# Altium integrated library ALTIUM-MJ_HORIZONTAL_PLASTIC-rev16a.IntLib: 68 symbols (continued)
## 634108149621 (continued)
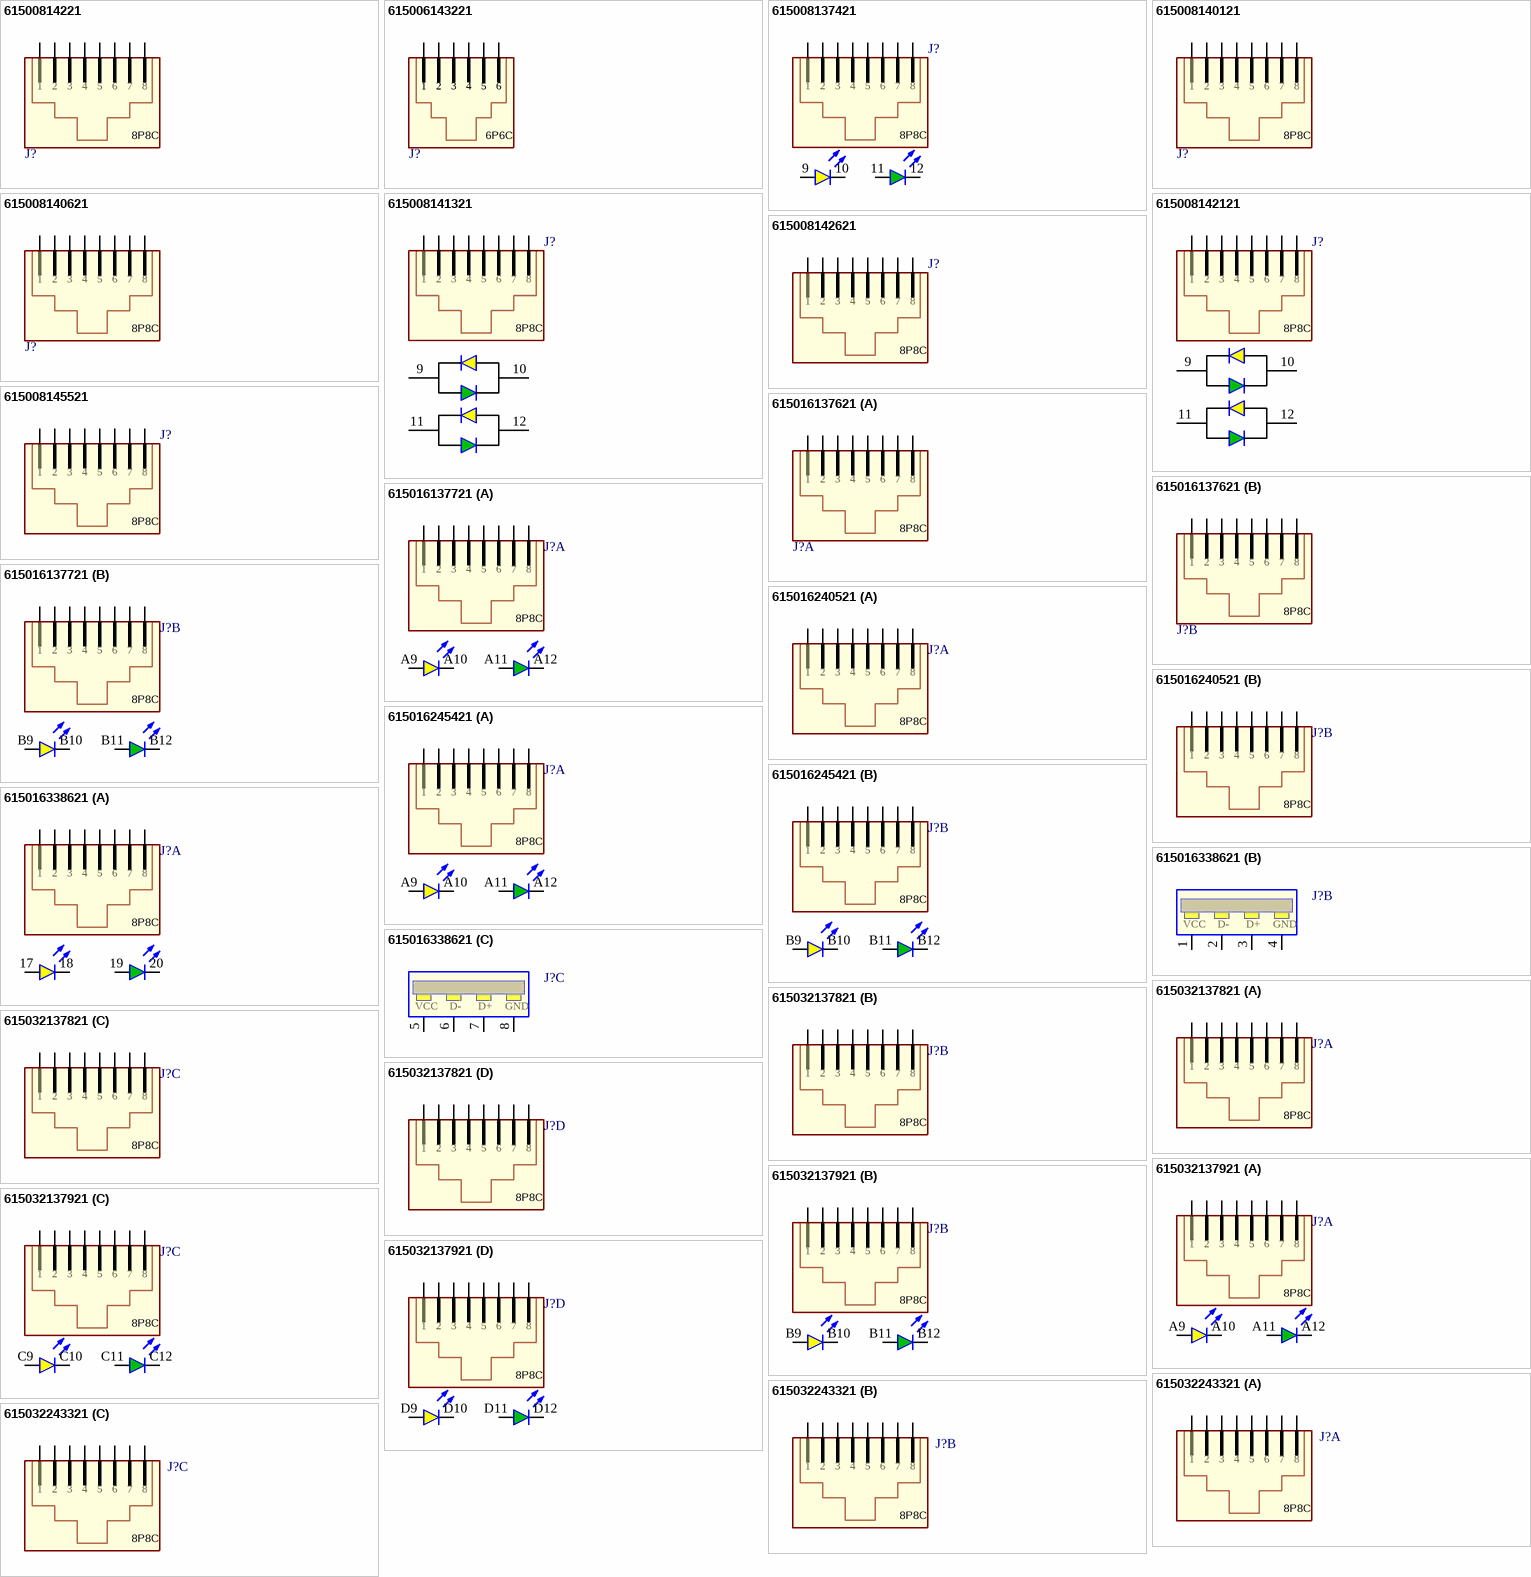
[diagram p3: symbols 61500814221 to 615032243321]

## 61500814221
designator J?
WR-MJ Modular Jack Horizontal Shielded 8P8C Tab Down; PartNumber: 61500814221; PublishedDate: July 2016; Publisher: Wurth Elektronik; ComponentLink1Description: Manufacturer; ComponentLink1URL: http://www.we-online.de; ComponentLink2Description: Datasheet; ComponentLink2URL: http://katalog.we-online.de/em/datasheet/61500814221.pdf; PinNumber: 8P8C
footprint 61500814221 (RJ45 Horizontal  Shielded  Tab down)
pins: 1, 2, 3, 4, 5, 6, 7, 8

## 615006143221
designator J?
WR-MJ Modular Jack Horizontal Shielded 6P6C Tab Up; PartNumber: 615006143221; PublishedDate: July 2016; Publisher: Wurth Elektronik; ComponentLink1Description: Manufacturer; ComponentLink1URL: http://www.we-online.de; ComponentLink2Description: Datasheet; ComponentLink2URL: http://katalog.we-online.de/em/datasheet/615006143221.pdf; PinNumber: 6P6C
footprint 615006143221 (Horizontal Shielded 1x1 TH    6P6C Tab Up)
pins: 1, 2, 3, 4, 5, 6

## 615008137421
designator J?
WR-MJ Modular Jack Horizontal Shielded w. LED and EMI Panel Finger 8P8C Tab Up; PartNumber: 615008137421; PublishedDate: July 2016; Publisher: Wurth Elektronik; ComponentLink1Description: Manufacturer; ComponentLink1URL: http://www.we-online.de; ComponentLink2Description: Datasheet; ComponentLink2URL: http://katalog.we-online.de/em/datasheet/615008137421.pdf; PinNumber: 8P8C
footprint 615008137421 (RJ45 Horizontal  Shielded  With LED With EMI panel ground Tab up - Left yellow - Right green)
pins: 1, 2, 3, 4, 5, 6, 7, 8, 9, 10, 11, 12

## 615008140121
designator J?
WR-MJ Modular Jack Horizontal Shielded 8P8C Tab Down; PartNumber: 615008140121; PublishedDate: July 2016; Publisher: Wurth Elektronik; ComponentLink1Description: Manufacturer; ComponentLink1URL: http://www.we-online.de; ComponentLink2Description: Datasheet; ComponentLink2URL: http://katalog.we-online.de/em/datasheet/615008140121%282%29.pdf; PinNumber: 8P8C
footprint 615008140121 (Horizontal Shielded 1x1 TH   3,05mm 8P8C Tab Down)
pins: 1, 2, 3, 4, 5, 6, 7, 8

## 615008140621
designator J?
WR-MJ Modular Jack Horizontal Shielded w. EMI Panel Finger 8P8C Tab Up; PartNumber: 615008140621; PublishedDate: July 2016; Publisher: Wurth Elektronik; ComponentLink1Description: Manufacturer; ComponentLink1URL: http://www.we-online.de; ComponentLink2Description: Datasheet; ComponentLink2URL: http://katalog.we-online.de/em/datasheet/615008140621.pdf; PinNumber: 8P8C
footprint 615008140621 (Horizontal Shielded 1x1 TH  EMI  fingers  8P8C Tab Up)
pins: 1, 2, 3, 4, 5, 6, 7, 8

## 615008141321
designator J?
WR-MJ Modular Jack Horizontal Shielded w. LED and EMI Panel Finger 8P8C Tab Up; PartNumber: 615008141321; PublishedDate: July 2016; Publisher: Wurth Elektronik; ComponentLink1Description: Manufacturer; ComponentLink1URL: http://www.we-online.de; ComponentLink2Description: Datasheet; ComponentLink2URL: http://katalog.we-online.de/em/datasheet/615008141321%282%29.pdf; PinNumber: 8P8C
footprint 615008141321 (Horizontal Shielded 1x1 TH LED 2x Bipolar Green/Yellow Green=Fw EMI  fingers  8P8C Tab Up)
pins: 1, 2, 3, 4, 5, 6, 7, 8, 9, 10, 11, 12

## 615008142121
designator J?
WR-MJ Modular Jack Horizontal Shielded w. LED and EMI Panel Finger 8P8C Tab Up; PartNumber: 615008142121; PublishedDate: July 2016; Publisher: Wurth Elektronik; ComponentLink1Description: Manufacturer; ComponentLink1URL: http://www.we-online.de; ComponentLink2Description: Datasheet; ComponentLink2URL: http://katalog.we-online.de/em/datasheet/615008142121.pdf; PinNumber: 8P8C
footprint 615008142121 (Horizontal Shielded 1x1 TH LED 2x Bipolar Yellow/Green Yellow=Fw EMI  fingers  8P8C Tab Up)
pins: 1, 2, 3, 4, 5, 6, 7, 8, 9, 10, 11, 12

## 615008142621
designator J?
WR-MJ Modular Jack Horizontal Shielded Rear Grounding Post 8P8C Tab Down; PartNumber: 615008142621; PublishedDate: July 2016; Publisher: Wurth Elektronik; ComponentLink1Description: Manufacturer; ComponentLink1URL: http://www.we-online.de; ComponentLink2Description: Datasheet; ComponentLink2URL: http://katalog.we-online.de/em/datasheet/615008142621.pdf; PinNumber: 8P8C
footprint 615008142621 (Horizontal Shielded 1x1 TH   rear EMI PCB post 8P8C Tab Down)
pins: 1, 2, 3, 4, 5, 6, 7, 8

## 615008145521
designator J?
WR-MJ Modular Jack Horizontal Shielded w. EMI Panel Finger 8P8C CAT 5e Tab Down; PartNumber: 615008145521; PublishedDate: July 2016; Publisher: Wurth Elektronik; ComponentLink1Description: Manufacturer; ComponentLink1URL: http://www.we-online.de; ComponentLink2Description: Datasheet; ComponentLink2URL: http://katalog.we-online.de/em/datasheet/615008145521.pdf; PinNumber: 8P8C
footprint 615008145521 (Cat 5e - Horizontal Shielded - 1x1 - TH -  EMI  fingers  - 8P8C - Tab Down)
pins: 1, 2, 3, 4, 5, 6, 7, 8

## 615016137621
designator J?
WR-MJ Modular Jack Horizontal Shielded Dual Port 8P8C Tab Down; PartNumber: 615016137621; PinNumber: 8P8C x2; PublishedDate: July 2016; Publisher: Wurth Elektronik; ComponentLink1Description: Manufacturer; ComponentLink1URL: http://www.we-online.de; ComponentLink2Description: Datasheet; ComponentLink2URL: http://katalog.we-online.de/em/datasheet/615016137621.pdf
footprint 615016137621 (RJ45 Horizontal Dual port Shielded Tab down)
part A pins: A1, A2, A3, A4, A5, A6, A7, A8
part B pins: B1, B2, B3, B4, B5, B6, B7, B8
part A text: 1; 2; 3; 4; 5; 6; 7; 8; 8P8C
part B text: 1; 2; 3; 4; 5; 6; 7; 8; 8P8C

## 615016137721
designator J?
WR-MJ Modular Jack Horizontal Shielded Dual Port w. EMI Panel Finger 8P8C Tab Up; PartNumber: 615016137721; PublishedDate: July 2016; Publisher: Wurth Elektronik; ComponentLink1Description: Manufacturer; ComponentLink1URL: http://www.we-online.de; ComponentLink2Description: Datasheet; ComponentLink2URL: http://katalog.we-online.de/em/datasheet/615016137721.pdf; PinNumber: 8P8C
footprint 615016137721 (RJ45 Horizontal Dual port Shielded  With LED With EMI panel ground Tab up - left yellow - right green)
part A pins: A1, A2, A3, A4, A5, A6, A7, A8, A9, A10, A11, A12
part B pins: B1, B2, B3, B4, B5, B6, B7, B8, B9, B10, B11, B12
part A text: 1; 2; 3; 4; 5; 6; 7; 8
part B text: 1; 2; 3; 4; 5; 6; 7; 8

## 615016240521
designator J?
WR-MJ Modular Jack Horizontal Shielded Dual Stacked w. EMI Panel Finger 8P8C Tab Up&Down; PartNumber: 615016240521; PinNumber: 8P8C x2; PublishedDate: July 2016; Publisher: Wurth Elektronik; ComponentLink1Description: Manufacturer; ComponentLink1URL: http://www.we-online.de; ComponentLink2Description: Datasheet; ComponentLink2URL: http://katalog.we-online.de/em/datasheet/615016240521.pdf
footprint 615016240521 (Horizontal Shielded 2x1 TH  EMI  fingers  8P8C Tab Down & Up)
part A pins: A1, A2, A3, A4, A5, A6, A7, A8
part B pins: B1, B2, B3, B4, B5, B6, B7, B8
part A text: 1; 2; 3; 4; 5; 6; 7; 8; 8P8C
part B text: 1; 2; 3; 4; 5; 6; 7; 8; 8P8C

## 615016245421
designator J?
WR-MJ Modular Jack Horizontal Shielded Dual Stacked w. LED and EMI Panel Finger 8P8C Tab Up&Down; PartNumber: 615016245421; PublishedDate: July 2016; Publisher: Wurth Elektronik; ComponentLink1Description: Manufacturer; ComponentLink1URL: http://www.we-online.de; ComponentLink2Description: Datasheet; ComponentLink2URL: http://katalog.we-online.de/em/datasheet/615016245421.pdf; PinNumber: 8P8C
footprint 615016245421 (Horizontal Shielded 2x1 TH  EMI  fingers with LED (Yellow=left / Green=right) 8P8C Tab Down & Up)
part A pins: A1, A2, A3, A4, A5, A6, A7, A8, A9, A10, A11, A12
part B pins: B1, B2, B3, B4, B5, B6, B7, B8, B9, B10, B11, B12
part A text: 1; 2; 3; 4; 5; 6; 7; 8
part B text: 1; 2; 3; 4; 5; 6; 7; 8

## 615016338621
designator J?
WR-MJ Modular Jack Tab Up . LED 8P8C Dual USB; PartNumber: 615016338621; PublishedDate: July 2016; Publisher: Wurth Elektronik; ComponentLink1Description: Manufacturer; ComponentLink1URL: http://www.we-online.de; ComponentLink2Description: Datasheet; ComponentLink2URL: http://katalog.we-online.de/em/datasheet/615016338621.pdf; PinNumber: 8P8C
footprint 615016338621 (RJ45 + dual USB stacked Horizontal Tab up)
part A pins: 9, 10, 11, 12, 13, 14, 15, 16, 17, 18, 19, 20
part B pins: 1 VCC, 2 D-, 3 D+, 4 GND
part C pins: 5 VCC, 6 D-, 7 D+, 8 GND

## 615032137821
designator J?
WR-MJ Modular Jack Horizontal Shielded Ganged 4 Ports 8P8C Tab Down; PartNumber: 615032137821; PinNumber: 8P8C x4; PublishedDate: July 2016; Publisher: Wurth Elektronik; ComponentLink1Description: Manufacturer; ComponentLink1URL: http://www.we-online.de; ComponentLink2Description: Datasheet; ComponentLink2URL: http://katalog.we-online.de/em/datasheet/615032137821.pdf
footprint 615032137821 (WR-MJ Modular Jack Horizontal Shielded Ganged 4 Ports 8P8C Tab Down)
part A pins: A1, A2, A3, A4, A5, A6, A7, A8
part B pins: B1, B2, B3, B4, B5, B6, B7, B8
part C pins: C1, C2, C3, C4, C5, C6, C7, C8
part D pins: D1, D2, D3, D4, D5, D6, D7, D8
part A text: 1; 2; 3; 4; 5; 6; 7; 8; 8P8C
part B text: 1; 2; 3; 4; 5; 6; 7; 8; 8P8C
part C text: 1; 2; 3; 4; 5; 6; 7; 8; 8P8C
part D text: 1; 2; 3; 4; 5; 6; 7; 8; 8P8C

## 615032137921
designator J?
WR-MJ Modular Jack Horizontal Shielded Ganged 4 Ports w. LED and EMI Panel Finger 8P8C Tab Up; PartNumber: 615032137921; PinNumber: 8P8C x4; PublishedDate: July 2016; Publisher: Wurth Elektronik; ComponentLink1Description: Manufacturer; ComponentLink1URL: http://www.we-online.de; ComponentLink2Description: Datasheet; ComponentLink2URL: http://katalog.we-online.de/em/datasheet/615032137921.pdf
footprint 615032137921 (RJ45 Horizontal Ganged 4 ports Shielded  With LED With EMI panel ground Tab up - left yellow - right green)
part A pins: A1, A2, A3, A4, A5, A6, A7, A8, A9, A10, A11, A12
part B pins: B1, B2, B3, B4, B5, B6, B7, B8, B9, B10, B11, B12
part C pins: C1, C2, C3, C4, C5, C6, C7, C8, C9, C10, C11, C12
part D pins: D1, D2, D3, D4, D5, D6, D7, D8, D9, D10, D11, D12
part A text: 1; 2; 3; 4; 5; 6; 7; 8; 8P8C
part B text: 1; 2; 3; 4; 5; 6; 7; 8; 8P8C
part C text: 1; 2; 3; 4; 5; 6; 7; 8; 8P8C
part D text: 1; 2; 3; 4; 5; 6; 7; 8; 8P8C

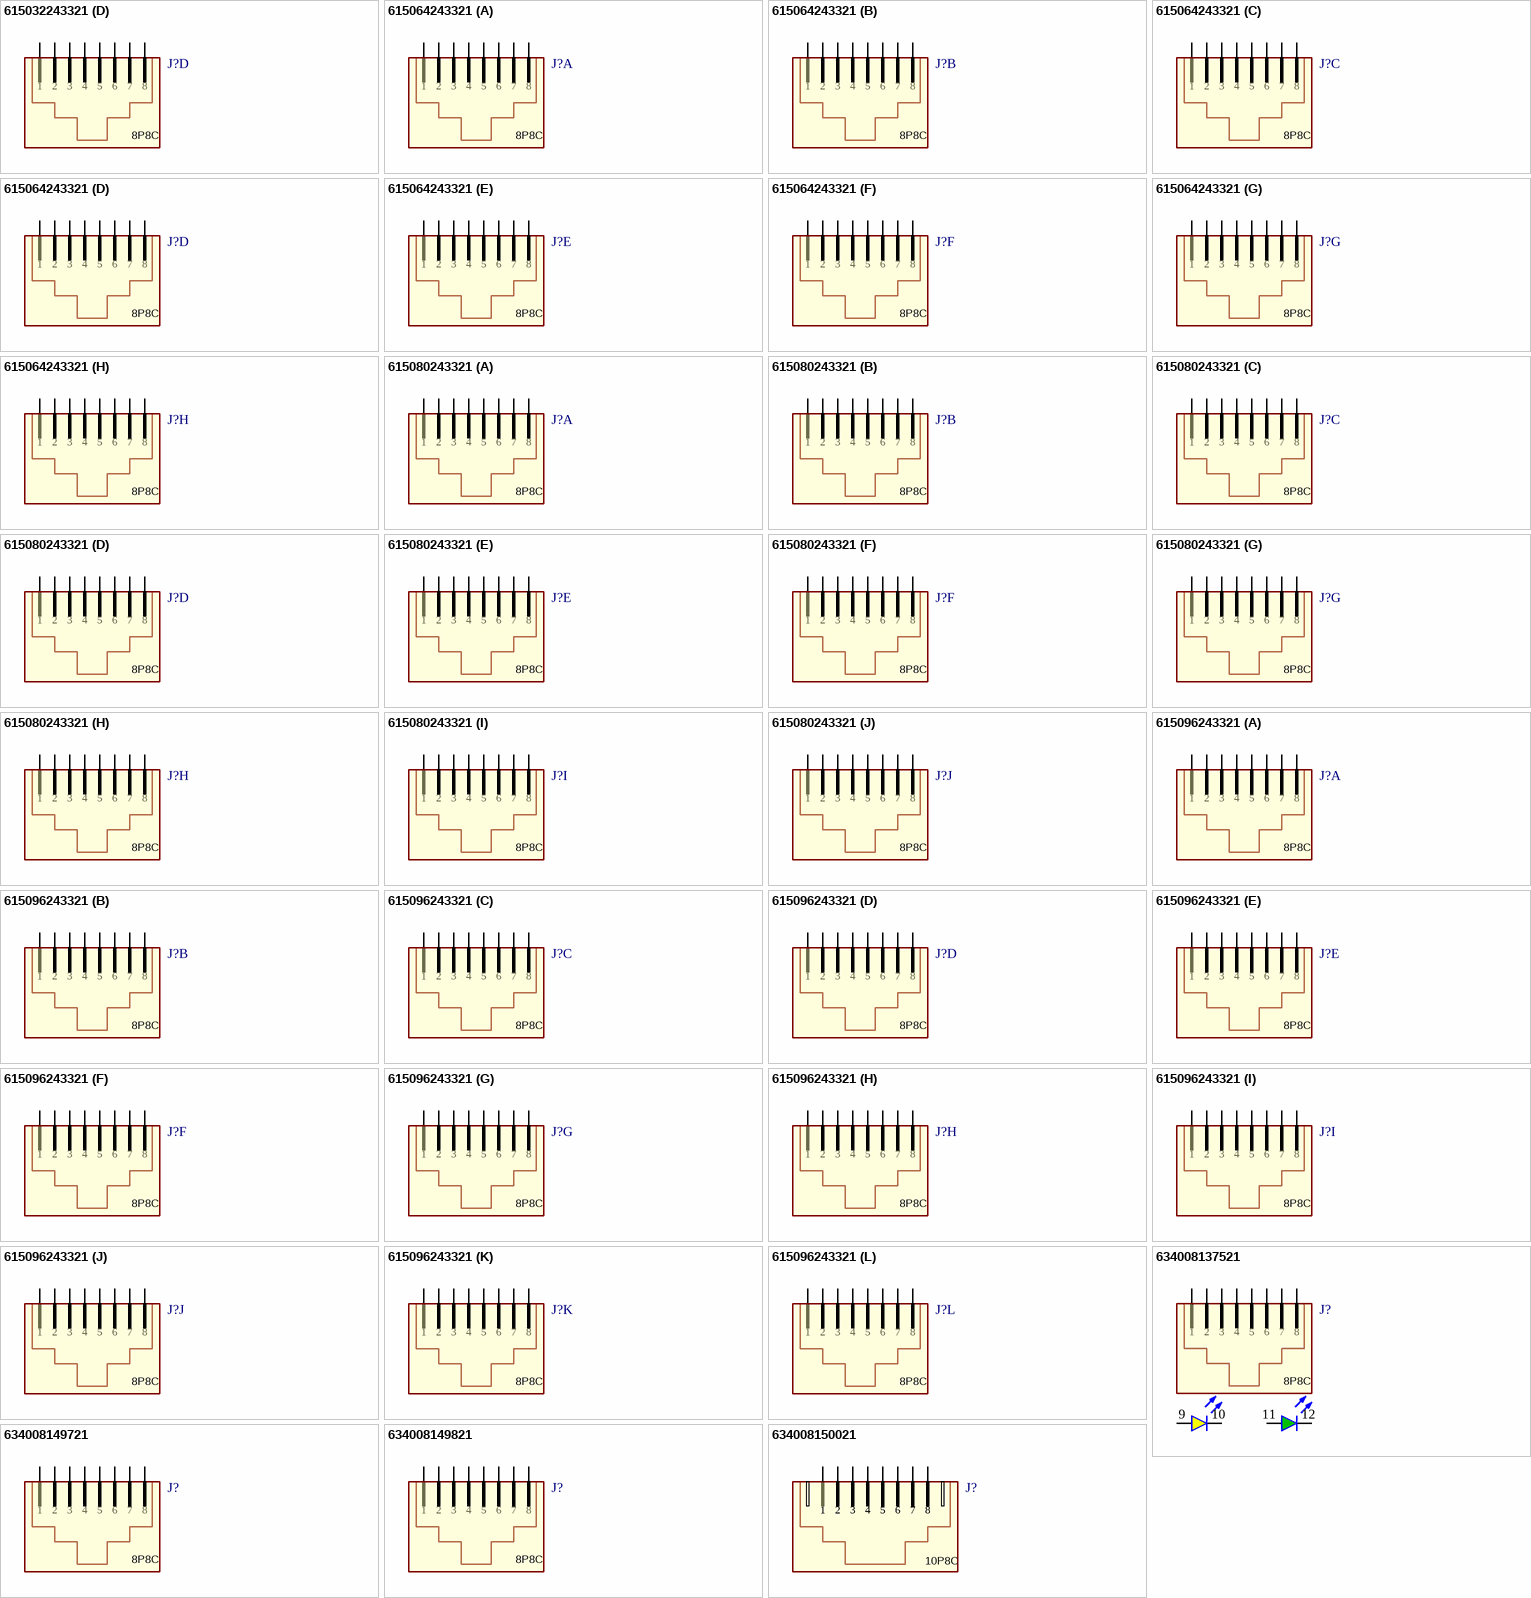
[diagram p4: symbols 615032243321 to 634008150021]

## 615032243321
designator J?
WR-MJ Modular Jack Horizontal Shielded 2x Dual Stacked w. EMI Panel Finger 8P8C Tab Up&Down; PartNumber: 615032243321; PinNumber: 8P8C x4; PublishedDate: July 2016; Publisher: Wurth Elektronik; ComponentLink1Description: Manufacturer; ComponentLink1URL: http://www.we-online.de; ComponentLink2Description: Datasheet; ComponentLink2URL: http://katalog.we-online.de/em/datasheet/615032243321.pdf
footprint 615032243321 (Horizontal Shielded 2x2 TH  EMI  fingers  8P8C Tab Down & Up)
part A pins: A1, A2, A3, A4, A5, A6, A7, A8
part B pins: B1, B2, B3, B4, B5, B6, B7, B8
part C pins: C1, C2, C3, C4, C5, C6, C7, C8
part D pins: D1, D2, D3, D4, D5, D6, D7, D8
part A text: 1; 2; 3; 4; 5; 6; 7; 8; 8P8C
part B text: 1; 2; 3; 4; 5; 6; 7; 8; 8P8C
part C text: 1; 2; 3; 4; 5; 6; 7; 8; 8P8C
part D text: 1; 2; 3; 4; 5; 6; 7; 8; 8P8C

## 615064243321
designator J?
WR-MJ Modular Jack Horizontal Shielded 2x 4 Stacked w. EMI Panel Finger 8P8C Tab Up&Down; PartNumber: 615064243321; PinNumber: 8P8C x8; PublishedDate: July 2016; Publisher: Wurth Elektronik; ComponentLink1Description: Manufacturer; ComponentLink1URL: http://www.we-online.de; ComponentLink2Description: Datasheet; ComponentLink2URL: http://katalog.we-online.de/em/datasheet/615064243321.pdf
footprint 615064243321 (Horizontal Shielded 2x4 TH  EMI  fingers  8P8C Tab Down & Up)
part A pins: A1, A2, A3, A4, A5, A6, A7, A8
part B pins: B1, B2, B3, B4, B5, B6, B7, B8
part C pins: C1, C2, C3, C4, C5, C6, C7, C8
part D pins: D1, D2, D3, D4, D5, D6, D7, D8
part E pins: E1, E2, E3, E4, E5, E6, E7, E8
part F pins: F1, F2, F3, F4, F5, F6, F7, F8
part G pins: G1, G2, G3, G4, G5, G6, G7, G8
part H pins: H1, H2, H3, H4, H5, H6, H7, H8
part A text: 1; 2; 3; 4; 5; 6; 7; 8; 8P8C
part B text: 1; 2; 3; 4; 5; 6; 7; 8; 8P8C
part C text: 1; 2; 3; 4; 5; 6; 7; 8; 8P8C
part D text: 1; 2; 3; 4; 5; 6; 7; 8; 8P8C
part E text: 1; 2; 3; 4; 5; 6; 7; 8; 8P8C
part F text: 1; 2; 3; 4; 5; 6; 7; 8; 8P8C
part G text: 1; 2; 3; 4; 5; 6; 7; 8; 8P8C
part H text: 1; 2; 3; 4; 5; 6; 7; 8; 8P8C

## 615080243321
designator J?
WR-MJ Modular Jack Horizontal Shielded 2x 5 Stacked w. EMI Panel Finger 8P8C Tab Up&Down; PartNumber: 615080243321; PinNumber: 8P8C x10; PublishedDate: July 2016; Publisher: Wurth Elektronik; ComponentLink1Description: Manufacturer; ComponentLink1URL: http://www.we-online.de; ComponentLink2Description: Datasheet; ComponentLink2URL: http://katalog.we-online.de/em/datasheet/615080243321.pdf
footprint 615080243321 (Horizontal Shielded 2x5 TH  EMI  fingers  8P8C Tab Down & Up)
part A pins: A1, A2, A3, A4, A5, A6, A7, A8
part B pins: B1, B2, B3, B4, B5, B6, B7, B8
part C pins: C1, C2, C3, C4, C5, C6, C7, C8
part D pins: D1, D2, D3, D4, D5, D6, D7, D8
part E pins: E1, E2, E3, E4, E5, E6, E7, E8
part F pins: F1, F2, F3, F4, F5, F6, F7, F8
part G pins: G1, G2, G3, G4, G5, G6, G7, G8
part H pins: H1, H2, H3, H4, H5, H6, H7, H8
part I pins: I1, I2, I3, I4, I5, I6, I7, I8
part J pins: J1, J2, J3, J4, J5, J6, J7, J8
part A text: 1; 2; 3; 4; 5; 6; 7; 8; 8P8C
part B text: 1; 2; 3; 4; 5; 6; 7; 8; 8P8C
part C text: 1; 2; 3; 4; 5; 6; 7; 8; 8P8C
part D text: 1; 2; 3; 4; 5; 6; 7; 8; 8P8C
part E text: 1; 2; 3; 4; 5; 6; 7; 8; 8P8C
part F text: 1; 2; 3; 4; 5; 6; 7; 8; 8P8C
part G text: 1; 2; 3; 4; 5; 6; 7; 8; 8P8C
part H text: 1; 2; 3; 4; 5; 6; 7; 8; 8P8C
part I text: 1; 2; 3; 4; 5; 6; 7; 8; 8P8C
part J text: 1; 2; 3; 4; 5; 6; 7; 8; 8P8C

## 615096243321
designator J?
WR-MJ Modular Jack Horizontal Shielded 2x 6 Stacked w. EMI Panel Finger 8P8C Tab Up&Down; PartNumber: 615096243321; PinNumber: 8P8C x12; PublishedDate: July 2016; Publisher: Wurth Elektronik; ComponentLink1Description: Manufacturer; ComponentLink1URL: http://www.we-online.de; ComponentLink2Description: Datasheet; ComponentLink2URL: http://katalog.we-online.de/em/datasheet/615096243321.pdf
footprint 615096243321 (Horizontal Shielded 2x6 TH  EMI  fingers  8P8C Tab Down & Up)
part A pins: A1, A2, A3, A4, A5, A6, A7, A8
part B pins: B1, B2, B3, B4, B5, B6, B7, B8
part C pins: C1, C2, C3, C4, C5, C6, C7, C8
part D pins: D1, D2, D3, D4, D5, D6, D7, D8
part E pins: E1, E2, E3, E4, E5, E6, E7, E8
part F pins: F1, F2, F3, F4, F5, F6, F7, F8
part G pins: G1, G2, G3, G4, G5, G6, G7, G8
part H pins: H1, H2, H3, H4, H5, H6, H7, H8
part I pins: I1, I2, I3, I4, I5, I6, I7, I8
part J pins: J1, J2, J3, J4, J5, J6, J7, J8
part K pins: K1, K2, K3, K4, K5, K6, K7, K8
part L pins: L1, L2, L3, L4, L5, L6, L7, L8
part A text: 1; 2; 3; 4; 5; 6; 7; 8; 8P8C
part B text: 1; 2; 3; 4; 5; 6; 7; 8; 8P8C
part C text: 1; 2; 3; 4; 5; 6; 7; 8; 8P8C
part D text: 1; 2; 3; 4; 5; 6; 7; 8; 8P8C
part E text: 1; 2; 3; 4; 5; 6; 7; 8; 8P8C
part F text: 1; 2; 3; 4; 5; 6; 7; 8; 8P8C
part G text: 1; 2; 3; 4; 5; 6; 7; 8; 8P8C
part H text: 1; 2; 3; 4; 5; 6; 7; 8; 8P8C
part I text: 1; 2; 3; 4; 5; 6; 7; 8; 8P8C
part J text: 1; 2; 3; 4; 5; 6; 7; 8; 8P8C
part K text: 1; 2; 3; 4; 5; 6; 7; 8; 8P8C
part L text: 1; 2; 3; 4; 5; 6; 7; 8; 8P8C

## 634008137521
designator J?
WR-MJ Modular Jack Horizontal Shielded SMT w. LED and EMI Panel Finger 8P8C Tab Up; PartNumber: 634008137521; PublishedDate: July 2016; Publisher: Wurth Elektronik; ComponentLink1Description: Manufacturer; ComponentLink1URL: http://www.we-online.de; ComponentLink2Description: Datasheet; ComponentLink2URL: http://katalog.we-online.de/em/datasheet/634008137521.pdf; PinNumber: 8P8C
footprint 634008137521 (RJ45 Horizontal  Shielded SMT With LED With EMI panel ground Tab up - Tray packaging)
pins: 1, 2, 3, 4, 5, 6, 7, 8, 9, 10, 11, 12

## 634008149721
designator J?
WR-MJ Modular Jack Horizontal Shielded SMT with EMI Panel Finger 8P8C; PartNumber: 634008149721; PublishedDate: July 2016; Publisher: Wurth Elektronik; ComponentLink1Description: Manufacturer; ComponentLink1URL: http://www.we-online.de; ComponentLink2Description: Datasheet; ComponentLink2URL: http://katalog.we-online.de/em/datasheet/634008149721.pdf; PinNumber: 8P8C
footprint 634008149721 (WR-MJ_Modular Jack_Tab UP_8P8C  With EMI panel ground)
pins: 1, 2, 3, 4, 5, 6, 7, 8

## 634008149821
designator J?
WR-MJ Modular Jack Horizontal Shielded SMT 8P8C Tab Up; PartNumber: 634008149821; PublishedDate: July 2016; Publisher: Wurth Elektronik; ComponentLink1Description: Manufacturer; ComponentLink1URL: http://www.we-online.de; ComponentLink2Description: Datasheet; ComponentLink2URL: http://katalog.we-online.de/em/datasheet/634008149821.pdf; PinNumber: 8P8C
footprint 634008149821 (WR-MJ_Modular Jack_Tab UP_8P8C)
pins: 1, 2, 3, 4, 5, 6, 7, 8

## 634008150021
designator J?
WR-MJ Modular Jack Horizontal Shielded Low Profile SMT 10P8C Tab Down; PartNumber: 634008150021; PublishedDate: July 2016; Publisher: Wurth Elektronik; ComponentLink1Description: Manufacturer; ComponentLink1URL: http://www.we-online.de; ComponentLink2Description: Datasheet; ComponentLink2URL: http://katalog.we-online.de/em/datasheet/634008150021.pdf; PinNumber: 10P8C
footprint 634008150021 (WR-MJ_Modular Jack_Tab DOWN_10P8C NULL)
pins: 1, 2, 3, 4, 5, 6, 7, 8


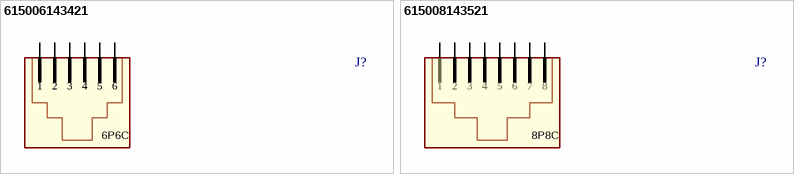
[diagram p5: symbols 615006143421 to 615008143521]

## 615006143421
designator J?
WR-MJ Modular Jack Horizontal Half Shielded 6P6C Tab Down; PartNumber: 615006143421; PublishedDate: July 2016; Publisher: Wurth Elektronik; ComponentLink1Description: Manufacturer; ComponentLink1URL: http://www.we-online.de; ComponentLink2Description: Datasheet; ComponentLink2URL: http://katalog.we-online.de/em/datasheet/615006143421.pdf; PinNumber: 6P6C
footprint 615006143421 (Horizontal Half-shielded 1x1 TH    6P6C Tab Down)
pins: 1, 2, 3, 4, 5, 6

## 615008143521
designator J?
WR-MJ Modular Jack Horizontal Half Shielded 8P8C Tab Down; PartNumber: 615008143521; PublishedDate: July 2016; Publisher: Wurth Elektronik; ComponentLink1Description: Manufacturer; ComponentLink1URL: http://www.we-online.de; ComponentLink2Description: Datasheet; ComponentLink2URL: http://katalog.we-online.de/em/datasheet/615008143521.pdf; PinNumber: 8P8C
footprint 615008143521 (Horizontal Half-shielded 1x1 TH    8P8C Tab Down)
pins: 1, 2, 3, 4, 5, 6, 7, 8


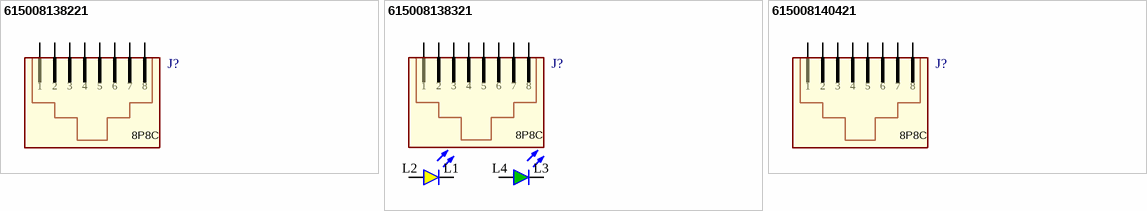
[diagram p6: symbols 615008138221 to 615008140421]

## 615008138221
designator J?
WR-MJ Modular Jack Vertical Shielded 8P8C Front Post; PartNumber: 615008138221; PublishedDate: July 2016; Publisher: Wurth Elektronik; ComponentLink1Description: Manufacturer; ComponentLink1URL: http://www.we-online.de; ComponentLink2Description: Datasheet; ComponentLink2URL: http://katalog.we-online.de/em/datasheet/615008138221.pdf; PinNumber: 8P8C
footprint 615008138221 (RJ45 Vertical  Shielded)
pins: 1, 2, 3, 4, 5, 6, 7, 8

## 615008138321
designator J?
WR-MJ Modular Jack Vertical Shielded 8P8C w. LED; PartNumber: 615008138321; PublishedDate: July 2016; Publisher: Wurth Elektronik; ComponentLink1Description: Manufacturer; ComponentLink1URL: http://www.we-online.de; ComponentLink2Description: Datasheet; ComponentLink2URL: http://katalog.we-online.de/em/datasheet/615008138321.pdf; PinNumber: 8P8C
footprint 615008138321 (RJ45 Vertical  Shielded  With LED - left yellow - right green)
pins: 1, 2, 3, 4, 5, 6, 7, 8, L1, L2, L3, L4

## 615008140421
designator J?
WR-MJ Modular Jack Vertical Shielded 8P8C Rear Post; PartNumber: 615008140421; PublishedDate: July 2016; Publisher: Wurth Elektronik; ComponentLink1Description: Manufacturer; ComponentLink1URL: http://www.we-online.de; ComponentLink2Description: Datasheet; ComponentLink2URL: http://katalog.we-online.de/em/datasheet/615008140421.pdf; PinNumber: 8P8C
footprint 615008140421 (Vertical Shielded 1x1 TH    8P8C)
pins: 1, 2, 3, 4, 5, 6, 7, 8


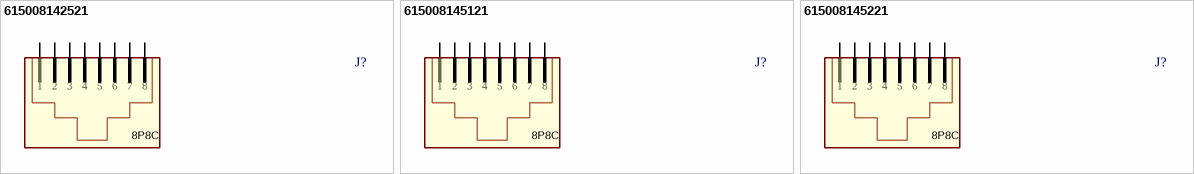
[diagram p7: symbols 615008142521 to 615008145221]

## 615008142521
designator J?
WR-MJ Modular Jack 45° Plastic 8P8C; PartNumber: 615008142521; PublishedDate: July 2016; Publisher: Wurth Elektronik; ComponentLink1Description: Manufacturer; ComponentLink1URL: http://www.we-online.de; ComponentLink2Description: Datasheet; ComponentLink2URL: http://katalog.we-online.de/em/datasheet/615008142521.pdf; PinNumber: 8P8C
footprint 615008142521 (45° Plastic 1x1 TH    8P8C)
pins: 1, 2, 3, 4, 5, 6, 7, 8

## 615008145121
designator J?
WR-MJ Modular Jack 45° Entry Shielded 8P8C Standard & Reverse Metal Post Trail; PartNumber: 615008145121; PublishedDate: July 2016; Publisher: Wurth Elektronik; ComponentLink1Description: Manufacturer; ComponentLink1URL: http://www.we-online.de; ComponentLink2Description: Datasheet; ComponentLink2URL: http://katalog.we-online.de/em/datasheet/615008145121.pdf; PinNumber: 8P8C
footprint 615008145121 (45° Shielded 1x1 TH  8P8C Reverse White)
pins: 1, 2, 3, 4, 5, 6, 7, 8

## 615008145221
designator J?
WR-MJ Modular Jack 45° Entry Shielded 8P8C Standard & Reverse Metal Post Trail; PartNumber: 615008145221; PublishedDate: July 2016; Publisher: Wurth Elektronik; ComponentLink1Description: Manufacturer; ComponentLink1URL: http://www.we-online.de; ComponentLink2Description: Datasheet; ComponentLink2URL: http://katalog.we-online.de/em/datasheet/615008145221.pdf; PinNumber: 8P8C
footprint 615008145221 (45° Shielded 1x1 TH  8P8C Standard White)
pins: 1, 2, 3, 4, 5, 6, 7, 8